# Altium footprint library MEBot.PcbLib: 161 footprints (part 3 of 11)
Each footprint in its own frame and in the unit in brackets; x right, y up, seen from the top. Pads: shape width x height; smd on the part's side, far side on the other; paste and mask are expansions set on the pad; w line width, h text height; cw(c..) or ccw(c..) is an arc to the next point about the centre after c.
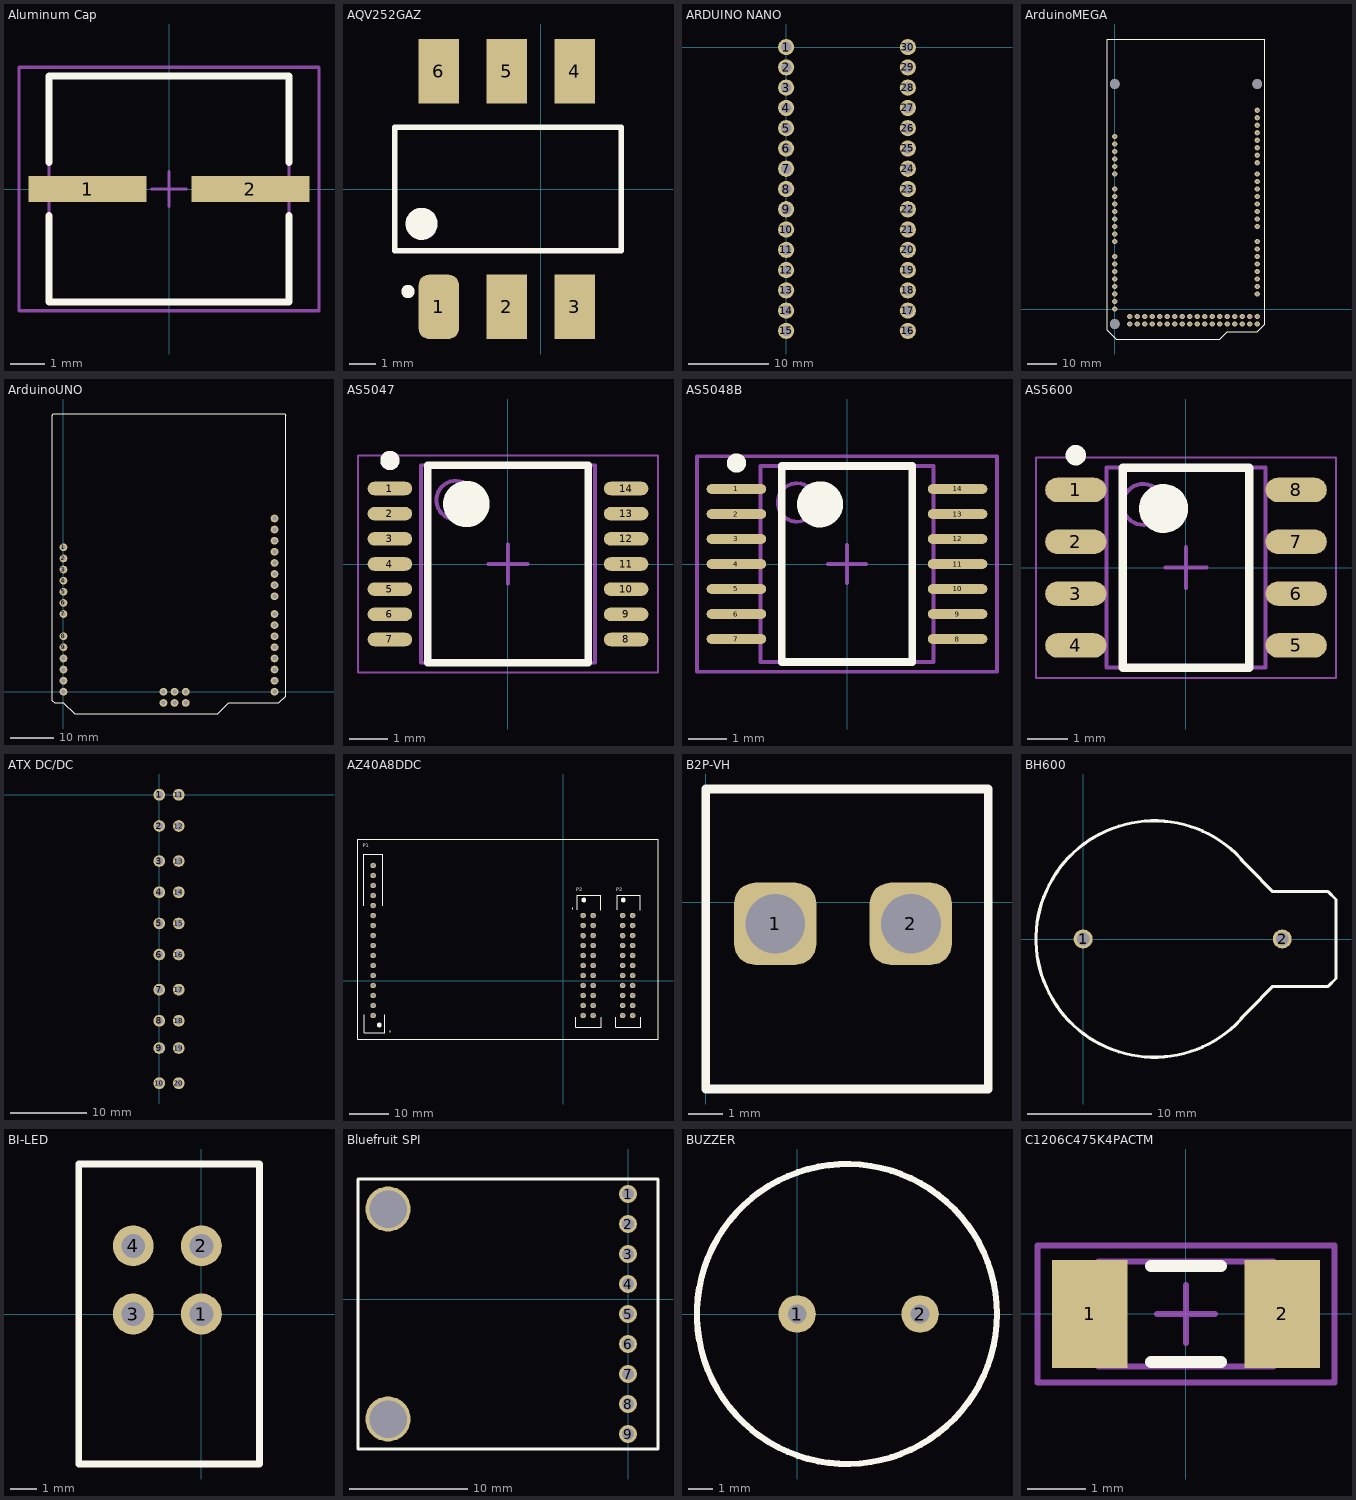
[diagram p2: the footprints below, top view; thin cyan lines are the x and y axes]

## Aluminum Cap [mm] "Capacitor, 2-Leads, Body 7.0x6.6mm, IPC Medium Density"
height 5.5
pads (2):
  rect 3.45x0.75 smd: 1(-2.375,0) 2(2.375,0)
Top Overlay:
  lines w0.2: -3.5,-0.775 -3.5,-3.3 3.5,-3.3 3.5,-0.775 ; -3.5,0.775 -3.5,3.3 3.5,3.3 3.5,0.775
Mechanical 13:
  lines w0.1: -3.5,-3.3 -3.5,3.3 3.5,3.3 3.5,-3.3 -3.5,-3.3
Mechanical 15:
  lines w0.1: -0.5,0 0.5,0 ; 0,-0.5 0,0.5 ; -4.375,-3.55 -4.375,3.55 4.375,3.55 4.375,-3.55 -4.375,-3.55
3D body: height 5.5, standoff 0, extent -3.25,-3.293 3.324,3.293

## AQV252GAZ [mm] "SSR RELAY SPST-NO 2.5A 0-60V"
height 3.5
pads (6):
  rrect50% 1.5x2.4 smd: 1(-3.81,-4.4)
  rect 1.5x2.4 smd: 2(-1.27,-4.4) 3(1.27,-4.4) 4(1.27,4.4) 5(-1.27,4.4) 6(-3.81,4.4)
Top Overlay:
  circle w0.25: c-4.96,-3.827 r0.125
  circle w0.6: c-4.45,-1.3 r0.3
  lines w0.2: -5.45,-2.3 -5.45,2.3 3,2.3 3,-2.3 -5.45,-2.3

## ARDUINO NANO [mil]
pads (30):
  round 80 hole 50: 1(0,0) 2(0,-100) 3(0,-200) 4(0,-300) 5(0,-400) 6(0,-500) 7(0,-600) 8(0,-700) 9(0,-800) 10(0,-900) 11(0,-1000) 12(0,-1100) 13(0,-1200) 14(0,-1300) 15(0,-1400) 16(600,-1400) 17(600,-1300) 18(600,-1200) 19(600,-1100) 20(600,-1000) 21(600,-900) 22(600,-800) 23(600,-700) 24(600,-600) 25(600,-500) 26(600,-400) 27(600,-300) 28(600,-200) 29(600,-100) 30(600,0)
3D body "Arduino Mini ASSY.STEP": height 484.65, standoff -222.83, extent -49.99,-1615.17 650.01,150.01

## ArduinoMEGA [mil]
pads (85):
  round 70 hole 40: 1(0,2300) 2(0,2200) 3(0,2100) 4(0,2000) 5(0,1900) 6(0,1800) 7(0,1600) 8(0,1500) 9(0,1400) 10(0,1300) 11(0,1200) 12(0,1100) 13(0,1000) 14(0,900) 15(0,700) 16(0,600) 17(0,500) 18(0,400) 19(0,300) 20(0,200) 21(0,100) 22(0,0) 23(1900,200) 24(1900,300) 25(1900,400) 26(1900,500) 27(1900,600) 28(1900,700) 29(1900,800) 30(1900,900) 31(1900,1100) 32(1900,1200) 33(1900,1300) 34(1900,1400) 35(1900,1500) 36(1900,1600) 37(1900,1700) 38(1900,1800) 39(1900,1950) 40(1900,2050) 41(1900,2150) 42(1900,2250) 43(1900,2350) 44(1900,2450) 45(1900,2550) 46(1900,2650) 47(1900,-100) 48(1900,-200) 49(1800,-100) 50(1800,-200) 51(1700,-100) 52(1700,-200) 53(1600,-100) 54(1600,-200) 55(1500,-100) 56(1500,-200) 57(1400,-100) 58(1400,-200) 59(1300,-100) 60(1300,-200) 61(1200,-100) 62(1200,-200) 63(1100,-100) 64(1100,-200) 65(1000,-100) 66(1000,-200) 67(900,-100) 68(900,-200) 69(800,-100) 70(800,-200) 71(700,-100) 72(700,-200) 73(600,-100) 74(600,-200) 75(500,-100) 76(500,-200) 77(400,-100) 78(400,-200) 79(300,-100) 80(300,-200) 81(200,-100) 82(200,-200)
  round 130 hole 130: ""(0,-200) ""(0,3000) ""(1900,3000)
Top Overlay:
  lines w10: -100,-280 -100,3600 2000,3600 2000,-200 1900,-300 1500,-300 1400,-400 20,-400 -100,-280
3D body "ArduinoMega.STEP": height -25, standoff -535, extent -96.5,-405 2006.5,3845

## ArduinoUNO [mil]
pads (35):
  round 70 hole 40: 1(0,1300) 2(0,1200) 3(0,1100) 4(0,1000) 5(0,900) 6(0,800) 7(0,700) 8(0,500) 9(0,400) 10(0,300) 11(0,200) 12(0,100) 13(0,0) 14(1900,0) 15(1900,100) 16(1900,200) 17(1900,300) 18(1900,400) 19(1900,500) 20(1900,600) 21(1900,700) 22(1900,860) 23(1900,960) 24(1900,1060) 25(1900,1160) 26(1900,1260) 27(1900,1360) 28(1900,1460) 29(1900,1560) 30(900,0) 31(1000,0) 32(1100,0) 33(900,-100) 34(1000,-100) 35(1100,-100)
Top Overlay:
  lines w10: -100,-80 -80,-100 0,-100 100,-200 1390,-200 1490,-100 1940,-100 2000,-40 2000,2490 1990,2500 1780,2500 -90,2500 -100,2490 -100,-80
3D body "ArduinoUNO.STEP": height -38.19, standoff -645.33, extent -100,-200 2000,2742.85

## AS5047 [mm] "ROTARY ENCODER MAGNETIC PROG"
height 1.2
pads (14):
  oval 1.15x0.35 smd: 1(-3.05,1.95) 2(-3.05,1.3) 3(-3.05,0.65) 4(-3.05,0) 5(-3.05,-0.65) 6(-3.05,-1.3) 7(-3.05,-1.95) 8(3.05,-1.95) 9(3.05,-1.3) 10(3.05,-0.65) 11(3.05,0) 12(3.05,0.65) 13(3.05,1.3) 14(3.05,1.95)
Top Overlay:
  circle w0.6: c-1.075,1.55 r0.3
  circle w0.25: c-3.05,2.675 r0.125
  lines w0.2: -2.075,-2.55 2.075,-2.55 2.075,2.55 -2.075,2.55 -2.075,-2.55
Mechanical 13:
  circle w0.1: c-1.35,1.65 r0.5
  lines w0.1: -2.25,-2.55 2.25,-2.55 2.25,2.55 -2.25,2.55 -2.25,-2.55
Mechanical 15:
  lines w0.05: -3.875,-2.8 3.875,-2.8 3.875,2.8 -3.875,2.8 -3.875,-2.8
  lines w0.1: -0.5,0 0.5,0 ; 0,-0.5 0,0.5
3D body: height 1.2, standoff 0.1, extent -2.25,-2.55 2.25,2.55

## AS5048B [mm] "TSOP, 14-Leads, Body 5.1x4.5mm (max), Pitch 0.65mm, IPC Medium Density"
height 1.2
pads (14):
  oval 1.55x0.25 smd: 1(-2.875,1.95) 2(-2.875,1.3) 3(-2.875,0.65) 4(-2.875,0) 5(-2.875,-0.65) 6(-2.875,-1.3) 7(-2.875,-1.95) 8(2.875,-1.95) 9(2.875,-1.3) 10(2.875,-0.65) 11(2.875,0) 12(2.875,0.65) 13(2.875,1.3) 14(2.875,1.95)
Top Overlay:
  circle w0.6: c-0.7,1.55 r0.3
  circle w0.25: c-2.875,2.625 r0.125
  lines w0.2: -1.7,-2.55 1.7,-2.55 1.7,2.55 -1.7,2.55 -1.7,-2.55
Mechanical 13:
  circle w0.1: c-1.3,1.6 r0.5
  lines w0.1: -2.25,-2.55 2.25,-2.55 2.25,2.55 -2.25,2.55 -2.25,-2.55
Mechanical 15:
  lines w0.1: -0.5,0 0.5,0 ; 0,-0.5 0,0.5 ; -3.9,-2.8 3.9,-2.8 3.9,2.8 -3.9,2.8 -3.9,-2.8
3D body: height 1.2, standoff 0.15, extent -2.25,-2.55 2.25,2.55

## AS5600 [mm] "SOIC, 8-Leads, Body 4.90x3.90mm, Pitch 1.27mm, IPC Medium Density"
height 1.75
pads (8):
  oval 1.5x0.6 smd: 1(-2.7,1.905) 2(-2.7,0.635) 3(-2.7,-0.635) 4(-2.7,-1.905) 5(2.7,-1.905) 6(2.7,-0.635) 7(2.7,0.635) 8(2.7,1.905)
Top Overlay:
  circle w0.6: c-0.55,1.45 r0.3
  circle w0.25: c-2.7,2.755 r0.125
  lines w0.2: -1.55,-2.45 1.55,-2.45 1.55,2.45 -1.55,2.45 -1.55,-2.45
Mechanical 13:
  circle w0.1: c-1.05,1.55 r0.5
  lines w0.1: -1.95,-2.45 1.95,-2.45 1.95,2.45 -1.95,2.45 -1.95,-2.45
Mechanical 15:
  lines w0.05: -3.675,-2.7 3.675,-2.7 3.675,2.7 -3.675,2.7 -3.675,-2.7
  lines w0.1: -0.5,0 0.5,0 ; 0,-0.5 0,0.5
3D body: height 1.75, standoff 0.1, extent -1.95,-2.45 1.95,2.45

## ATX DC/DC [mil]
pads (20):
  round 60 hole 40: 1(0,0) 2(0,-160) 3(0,-340) 4(0,-500) 5(0,-660) 6(0,-820) 7(0,-1000) 8(0,-1160) 9(0,-1300) 10(0,-1480) 11(100,0) 12(100,-160) 13(100,-340) 14(100,-500) 15(100,-660) 16(100,-820) 17(100,-1000) 18(100,-1160) 19(100,-1300) 20(100,-1480)
3D body "pico_PSU.STEP": height -69.29, standoff -1305.51, extent -303.23,-1608.04 543.23,140

## AZ40A8DDC [mil] "Pitch 2.54 mm"
height 393.7
pads (60):
  round 55 hole 35: 1(-1903.86,-345) 1a(296.14,655) 1a(691.14,655) 1b(196.14,655) 1b(591.14,655) 2(-1903.86,-245) 2a(296.14,555) 2a(691.14,555) 2b(196.14,555) 2b(591.14,555) 3(-1903.86,-145) 3a(296.14,455) 3a(691.14,455) 3b(196.14,453.43) 3b(591.14,453.43) 4(-1903.86,-45) 4a(296.14,355) 4a(691.14,355) 4b(196.14,355) 4b(591.14,355) 5(-1903.86,55) 5a(296.14,255) 5a(691.14,255) 5b(196.14,255) 5b(591.14,255) 6(-1903.86,155) 6a(296.14,155) 6a(691.14,155) 6b(196.14,155) 6b(591.14,155) 7(-1903.86,255) 7a(296.14,55) 7a(691.14,55) 7b(196.14,55) 7b(591.14,55) 8(-1903.86,355) 8a(296.14,-45) 8a(691.14,-45) 8b(196.14,-45) 8b(591.14,-45) 9(-1903.86,455) 9a(296.14,-145) 9a(691.14,-145) 9b(196.14,-145) 9b(591.14,-145) 10(-1903.86,555) 10a(296.14,-245) 10a(691.14,-245) 10b(196.14,-245) 10b(591.14,-245) 11(-1903.86,655) 11a(296.14,-345) 11a(691.14,-345) 11b(196.14,-345) 11b(591.14,-345) 12(-1903.86,755) 13(-1903.86,855) 14(-1903.86,955) 15(-1903.86,1055) 16(-1903.86,1155)
Top Overlay:
  circle w9.84: c-1734.92,-505 r4.92
  circle w23.62: c-1841.81,-440 r11.81
  circle w9.84: c90.08,725 r4.92
  circle w23.62: c203.19,810 r11.81
  circle w23.62: c598.19,810 r11.81
  lines w7.87: -2000,1270 -1810,1270 ; -1990,-515 -1790,-515 ; 125,-465 375,-465 ; 140,855 370,855 ; 520,-465 770,-465 ; 535,855 765,855
  lines w10: -2000,755 -2000,1270 ; -1990,-515 -1990,-340 ; -1810,755 -1810,1270 ; -1790,-515 -1790,-340 ; 125,-465 125,-365 ; 140,711.3 140,855 ; 370,709.53 370,855 ; 375,-465 375,-365 ; 520,-465 520,-365 ; 535,711.3 535,855 ; 765,709.53 765,855 ; 770,-465 770,-365 ; -2055,-580 945,-580 945,1420 -2055,1420 -2055,-580
  text "P1" at -2010,1325 h60
  text "P2" at 130,880 h60
  text "P2" at 525,880 h60

## B2P-VH [mm] "CONN HEADER VERT 2POS 3.96MM"
pads (2):
  rrect50% 2.4x2.4 hole 1.75: 1(2.032,-0.635) 2(5.992,-0.635)
Top Overlay:
  lines w0.254: 0,-5.461 8.255,-5.461 8.255,3.302 0,3.302 0,-5.461
3D body "User Library-B2P-VH.STEP": height 10.9, standoff -3.7, extent 0.134,-5.207 7.994,3.293

## BH600 [mil] "Battery holder"
pads (2):
  round 60 hole 40: 1(0,0) 2(629.92,0)
Top Overlay:
  lines w10: 500,-250 525,-225 600,-150 775,-150 800,-125 800,125 775,150 600,150 525,225 500,250 ; 511.51,-240.41 cw(c225,0) 511.51,240.41

## BI-LED [mil]
pads (4):
  round 60 hole 35: 1(0,0) 2(0,100) 3(-100,0) 4(-100,100)
Top Overlay:
  lines w10: -180,-220 -180,220 85,220 85,-220 -180,-220
3D body "Bi-LED.STEP": height 85.83, standoff -548.03, extent -197.72,-395.12 70,215.12

## Bluefruit SPI [mil] "Digital part # 1528-1375-ND"
pads (11):
  round 60 hole 40: 1(0,350) 2(0,250) 3(0,150) 4(0,50) 5(0,-50) 6(0,-150) 7(0,-250) 8(0,-350) 9(0,-450)
  round 150 hole 125: ""(-800,-400) ""(-800,300)
Top Overlay:
  lines w10: -900,-500 -900,400 100,400 100,-500 -900,-500

## BUZZER [mil]
pads (2):
  round 60 hole 30: 1(0,0) 2(196.85,0)
Top Overlay:
  circle w10: c79.84,0 r240.16
3D body "buzzer.STEP": height 255.91, standoff -157.48, extent -160.16,-240 320.16,240.31

## C1206C475K4PACTM [mm] "Chip Capacitor, 2-Leads, Body 3.2x1.6mm, IPC Medium Density"
height 1.6
pads (2):
  rect 1.3x1.85 smd: 1(-1.65,0) 2(1.65,0)
Top Overlay:
  lines w0.2: -0.6,-0.825 0.6,-0.825 ; -0.6,0.825 0.6,0.825
Mechanical 13:
  lines w0.1: -1.5,-0.9 1.5,-0.9 1.5,0.9 -1.5,0.9 -1.5,-0.9
Mechanical 15:
  lines w0.1: -0.5,0 0.5,0 ; 0,-0.5 0,0.5 ; -2.55,-1.175 2.55,-1.175 2.55,1.175 -2.55,1.175 -2.55,-1.175
3D body: height 1.6, standoff 0, extent -1.5,-0.9 1.5,0.9